# Altium footprint library AltiumLibraries.PcbLib: 247 footprints (part 9 of 16)
Each footprint in its own frame and in the unit in brackets; x right, y up, seen from the top. Pads: shape width x height; smd on the part's side, far side on the other; paste and mask are expansions set on the pad; w line width, h text height; cw(c..) or ccw(c..) is an arc to the next point about the centre after c.
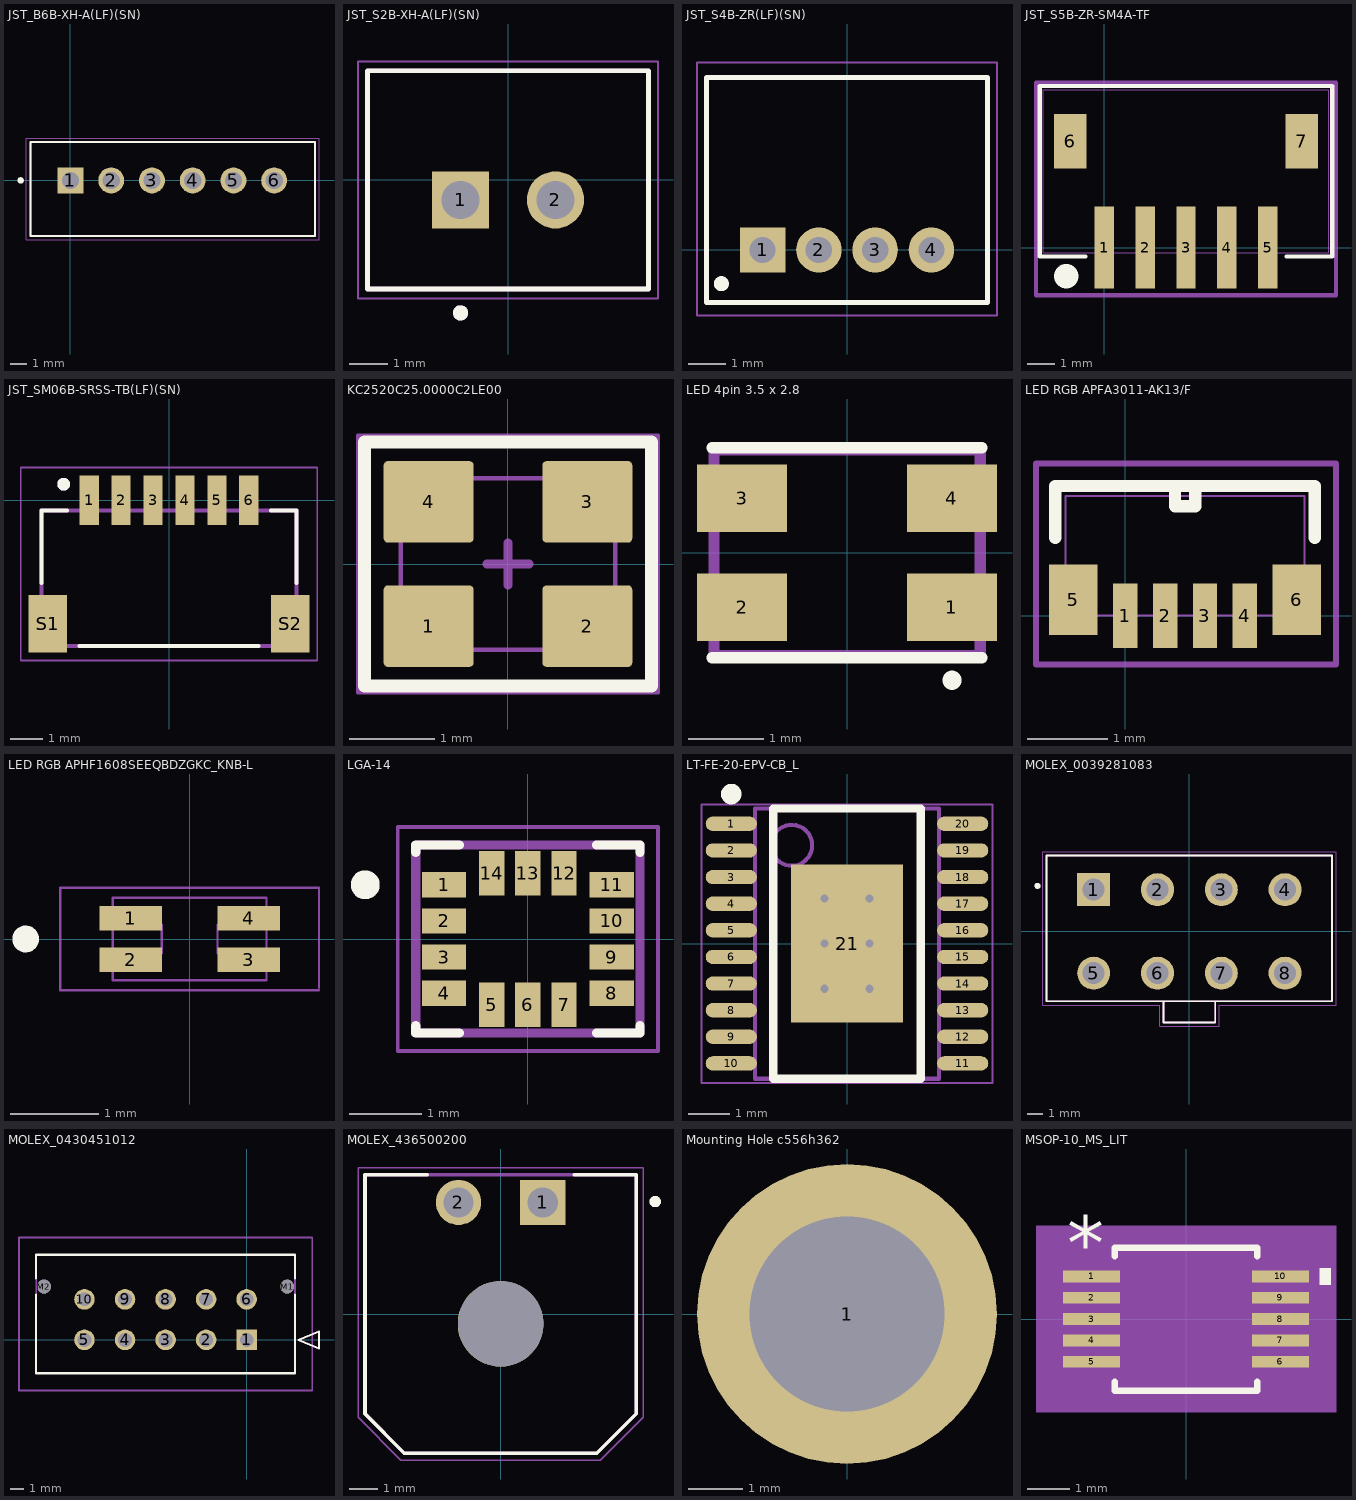
[diagram p8: the footprints below, top view; thin cyan lines are the x and y axes]

## JST_B6B-XH-A(LF)(SN) [mm]
pads (6):
  rect 1.59x1.59 hole 1.06: 1(0,0)
  round 1.59 hole 1.06: 2(2.5,0) 3(5,0) 4(7.5,0) 5(10,0) 6(12.5,0)
Top Overlay:
  circle w0.2: c-3.06,0 r0.1
  lines w0.127: -2.45,-3.4 -2.45,2.35 15,2.35 15,-3.4 -2.45,-3.4
Mechanical 13:
  lines w0.127: -2.45,-3.4 -2.45,2.35 15,2.35 15,-3.4 -2.45,-3.4
Mechanical 15:
  lines w0.05: -2.7,-3.65 -2.7,2.6 15.25,2.6 15.25,-3.65 -2.7,-3.65

## JST_S2B-XH-A(LF)(SN) [mm]
pads (2):
  rect 1.508x1.508 hole 1: 1(-1.25,-0.525)
  round 1.508 hole 1: 2(1.25,-0.525)
Top Overlay:
  circle w0.2: c-1.25,-3.5 r0.1
  lines w0.127: -3.7,-2.875 -3.7,2.875 3.7,2.875 3.7,-2.875 -3.7,-2.875
Mechanical 13:
  circle w0.2: c-1.25,-3.5 r0.1
  lines w0.127: -3.7,-2.875 -3.7,2.875 3.7,2.875 3.7,-2.875 -3.7,-2.875
Mechanical 15:
  lines w0.05: -3.95,-3.125 -3.95,3.125 3.95,3.125 3.95,-3.125 -3.95,-3.125
3D body "S2B XH-A.step": height 6.1, standoff -2, extent -3.717,-2.864 3.683,8.636

## JST_S4B-ZR(LF)(SN) [mm]
pads (4):
  rect 1.208x1.208 hole 0.7: 1(-2.25,0)
  round 1.208 hole 0.7: 2(-0.75,0) 3(0.75,0) 4(2.25,0)
Top Overlay:
  circle w0.2: c-3.35,-0.9 r0.1
  lines w0.127: -3.75,-1.4 3.75,-1.4 3.75,4.6 -3.75,4.6 -3.75,-1.4
Mechanical 16:
  lines w0.05: -4,-1.75 4,-1.75 4,5 -4,5 -4,-1.75
3D body "S4B-ZR.STEP": height 3.7, standoff -2.7, extent -3.75,-1.428 3.75,4.572

## JST_S5B-ZR-SM4A-TF [mil]
pads (7):
  rect 28x118 smd paste+0: 1(0,0) 2(59.06,0) 3(118.11,0) 4(177.17,0) 5(236.22,0)
  rect 47x79 smd: 6(-49.21,153.62) 7(285.43,153.62)
Top Overlay:
  circle w35.43: c-55.12,-41.34 r0.04
  lines w6: -27.1,-12.69 -93.39,-12.69 -93.39,233.31 329.61,233.31 329.61,-12.69 263.32,-12.69
Mechanical 13:
  lines w1: -88.39,-7.69 -88.39,228.31 324.61,228.31 324.61,-7.69 -88.39,-7.69
Mechanical 15:
  lines w6: -98.71,-69 334.93,-69 334.93,238.31 -98.71,238.31 -98.71,-69
3D body: height 10, standoff 0, extent 0,0 10,10
3D body "S5B-ZR-SM4A-TF.STEP": height 145.67, standoff 0, extent -88.39,-27.6 325,228.31

## JST_SM06B-SRSS-TB(LF)(SN) [mm]
pads (8):
  rect 0.6x1.55 smd: 1(-2.5,0) 2(-1.5,0) 3(-0.5,0) 4(0.5,0) 5(1.5,0) 6(2.5,0)
  rect 1.2x1.8 smd: S1(-3.8,-3.875) S2(3.8,-3.875)
Top Overlay:
  circle w0.2: c-3.3,0.5 r0.1
  lines w0.127: -4,-2.6 -4,-0.325 -3.2,-0.325 ; -2.8,-4.575 2.8,-4.575 ; 3.2,-0.325 4,-0.325 4,-2.6
Mechanical 13:
  circle w0.2: c-3.3,0.5 r0.1
  lines w0.127: -4,-4.575 -4,-0.325 4,-0.325 4,-4.575 -4,-4.575
Mechanical 15:
  lines w0.05: -4.65,-5.025 -4.65,1.025 4.65,1.025 4.65,-5.025 -4.65,-5.025
3D body "SM06B-SRSS-TB.STEP": height 2.91, standoff -0.05, extent -4,-4.67 4,0.28

## KC2520C25.0000C2LE00 [mm]
pads (4):
  rrect10% 1.05x0.95 smd: 1(-0.925,-0.725) 2(0.925,-0.725) 3(0.925,0.725) 4(-0.925,0.725)
Top Overlay:
  lines w0.152: -1.675,-1.425 1.675,-1.425 1.675,1.425 -1.675,1.425 -1.675,-1.425
Mechanical 13:
  lines w0.05: -1.25,-1 1.25,-1 1.25,1 -1.25,1 -1.25,-1
Mechanical 15:
  lines w0.05: -1.75,-1.5 1.75,-1.5 1.75,1.5 -1.75,1.5 -1.75,-1.5
  lines w0.1: -0.25,0 0.25,0 ; 0,-0.25 0,0.25
3D body "KC2520C25.0000C2LE00.STEP": height 0.75, standoff 0, extent -1.25,-1 1.25,1

## LED 4pin 3.5 x 2.8 [mm] "LED 3 COLOR 3.5mm x 2.8mm"
pads (4):
  rect 1.2x0.9 smd: 1(1.4,-0.725) 2(-1.4,-0.725) 3(-1.4,0.725) 4(1.4,0.725)
Top Overlay:
  circle w0.254: c1.4,-1.7 r0.001
  lines w0.152: -1.8,-1.4 1.8,-1.4 ; -1.8,1.4 1.8,1.4
Mechanical 13:
  lines w0.152: -1.774,-1.374 1.774,-1.374 1.774,1.374 -1.774,1.374 -1.774,-1.374
3D body "AAA3528.STEP": height 1.9, standoff 0, extent -1.75,-1.4 1.75,1.4

## LED RGB APFA3011-AK13/F [mil]
pads (6):
  rect 12x32 smd paste+0 mask+0: 1(0,0) 2(19.69,0) 3(39.37,0) 4(59.06,0)
  rect 24x35 smd paste+0 mask+0: 5(-25.59,7.87) 6(84.65,7.87)
Top Overlay:
  lines w6: -34.47,38.47 -34.47,64 93.53,64 93.53,38.47 ; 24.53,54 24.53,64 34.53,64 34.53,54 24.53,54
Mechanical 13:
  lines w1: -29.47,0 -29.47,59 88.53,59 88.53,0 -29.47,0
Mechanical 15:
  lines w2.95: -44,-24 104,-24 104,75 -44,75 -44,-24
3D body: height 39.37, standoff 0, extent -39,-19 99.01,69
3D body "APFA3011.step": height -1069.18, standoff -1128.33, extent -121670.11,144710.08 -121552.01,144749.46
3D body "APFA3011.step": height -1069.18, standoff -1128.33, extent -121671.11,144741.09 -121553.01,144780.46
3D body "APFA3011.step": height -1069.18, standoff -1128.33, extent -121677.11,144799.08 -121559,144838.45
3D body "APFA3011.step": height -1069.18, standoff -1128.33, extent -121699.57,144769.08 -121581.47,144808.45
3D body "APFA3011.step": height -1069.18, standoff -1128.33, extent -121639.12,144737.08 -121521.01,144776.46
3D body "APFA3011.step": height -1069.18, standoff -1128.33, extent -121639.12,144737.08 -121521.01,144776.45
3D body "APFA3011.step": height -1069.18, standoff -1128.33, extent -121639.11,144737.08 -121521,144776.46
3D body "APFA3011.step": height -1069.18, standoff -1128.33, extent -121638.11,144734.08 -121520.01,144773.46
3D body "APFA3011.step": height -1069.18, standoff -1128.33, extent -121636.11,144735.09 -121518.01,144774.46
3D body "APFA3011.step": height -1069.18, standoff -1128.33, extent -121642.1,144736.08 -121524,144775.45
3D body "APFA3011.step": height -1069.18, standoff -1128.33, extent -121642.11,144736.08 -121524.01,144775.45
3D body "APFA3011.step": height -1069.18, standoff -1128.33, extent -121687.11,144792.08 -121569,144831.46
3D body "APFA3011.step": height -1069.18, standoff -1128.33, extent -121633.11,144737.08 -121515.01,144776.46
3D body "APFA3011.step": height -1069.18, standoff -1128.33, extent -121631.11,144735.09 -121513,144774.46
3D body "APFA3011.step": height -1069.18, standoff -1128.33, extent -121653.11,144791.08 -121535.01,144830.46
3D body "APFA3011.step": height -1069.18, standoff -1128.33, extent -121634.11,144798.08 -121516.01,144837.46
3D body "APFA3011.step": height -1069.18, standoff -1128.33, extent -121648.11,144801.08 -121530,144840.46
3D body "APFA3011.sldprt": height -1069.18, standoff -1128.33, extent -121654.11,144677.08 -121536,144716.46
3D body "APFA3011.sldprt": height -1069.18, standoff -1128.33, extent -121669.11,144708.08 -121551.01,144747.46
3D body "APFA3011.sldprt": height -1069.18, standoff -1128.33, extent -121695.11,144783.08 -121577,144822.46
3D body "APFA3011.sldprt": height -1069.18, standoff -1128.33, extent -121670.11,144753.08 -121552,144792.46
3D body "APFA3011.sldprt": height -1069.18, standoff -1128.33, extent -121701.11,144816.08 -121583,144855.46
3D body "APFA3011.sldprt": height -1069.18, standoff -1128.33, extent -121694.11,144801.08 -121576,144840.45

## LED RGB APHF1608SEEQBDZGKC_KNB-L [mil]
pads (4):
  rect 28x11 smd paste+0 mask+0: 1(-26.5,9.35) 2(-26.5,-9.35) 3(26.5,-9.35) 4(26.5,9.35)
Top Overlay:
  circle w6: c-73.5,0 r3
Mechanical 13:
  circle w0: c-21.5,9.35 r3
  lines w1: -34.5,-18.5 34.5,-18.5 34.5,18.5 -34.5,18.5 -34.5,-18.5 ; -34.5,-6.5 -34.5,6.5 -12.5,6.5 -12.5,-6.5 -34.5,-6.5 ; 12.5,-6.5 12.5,6.5 34.5,6.5 34.5,-6.5 12.5,-6.5
Mechanical 15:
  lines w0.98: 58,-23 -58,-23 -58,23 58,23 58,-22
3D body "APHF1608.STEP": height 23.13, standoff 3.44, extent -31.49,-15.75 31.5,15.74
3D body: height 10, standoff 0, extent -56,-21 56,21

## LGA-14 [mm]
pads (14):
  rect 0.61x0.35 smd: 1(-1.16,0.75) 2(-1.16,0.25) 3(-1.16,-0.25) 4(-1.16,-0.75) 8(1.16,-0.75) 9(1.16,-0.25) 10(1.16,0.25) 11(1.16,0.75)
  rect 0.35x0.61 smd: 5(-0.5,-0.91) 6(0,-0.91) 7(0.5,-0.91) 12(0.5,0.91) 13(0,0.91) 14(-0.5,0.91)
Top Overlay:
  circle w0.2: c-2.25,0.75 r0.1
  lines w0.127: -1.55,-1.2 -1.55,-1.3 -0.95,-1.3 ; -1.55,1.2 -1.55,1.3 -0.95,1.3 ; 0.95,-1.3 1.55,-1.3 1.55,-1.2 ; 0.95,1.3 1.55,1.3 1.55,1.2
Mechanical 4:
  lines w0.127: -1.55,-1.3 1.55,-1.3 ; -1.55,-1.3 -1.55,1.3 ; -1.55,-1.3 1.55,-1.3 ; -1.55,-1.3 -1.55,1.3 ; -1.55,1.3 1.55,1.3 ; -1.55,1.3 1.55,1.3 ; 1.55,-1.3 1.55,1.3 ; 1.55,-1.3 1.55,1.3
Mechanical 16:
  lines w0.05: -1.8,-1.55 1.8,-1.55 1.8,1.55 -1.8,1.55 -1.8,-1.55

## LT-FE-20-EPV-CB_L [mm] "SOP, 20-Leads, Body 6.6x4.5mm, Pitch 0.65mm, Thermal Pad 3.86x2.74mm, IPC High Density"
height 1.2
pads (21):
  oval 1.25x0.35 smd: 1(-2.825,2.925) 2(-2.825,2.275) 3(-2.825,1.625) 4(-2.825,0.975) 5(-2.825,0.325) 6(-2.825,-0.325) 7(-2.825,-0.975) 8(-2.825,-1.625) 9(-2.825,-2.275) 10(-2.825,-2.925) 11(2.825,-2.925) 12(2.825,-2.275) 13(2.825,-1.625) 14(2.825,-0.975) 15(2.825,-0.325) 16(2.825,0.325) 17(2.825,0.975) 18(2.825,1.625) 19(2.825,2.275) 20(2.825,2.925)
  rect 2.74x3.86 smd: 21(0,0)
via 0.55,-1.1 diameter 0.5 hole 0.2
via -0.55,-1.1 diameter 0.5 hole 0.2
via 0.55,0 diameter 0.5 hole 0.2
via -0.55,0 diameter 0.5 hole 0.2
via 0.55,1.1 diameter 0.5 hole 0.2
via -0.55,1.1 diameter 0.5 hole 0.2
Top Overlay:
  circle w0.25: c-2.825,3.65 r0.125
  lines w0.2: -1.8,-3.3 1.8,-3.3 1.8,3.3 -1.8,3.3 -1.8,-3.3
Mechanical 13:
  circle w0.1: c-1.35,2.4 r0.5
  lines w0.1: -2.25,-3.3 2.25,-3.3 2.25,3.3 -2.25,3.3 -2.25,-3.3
Mechanical 15:
  lines w0.05: -3.55,-3.4 3.55,-3.4 3.55,3.4 -3.55,3.4 -3.55,-3.4
  lines w0.1: -0.5,0 0.5,0 ; 0,-0.5 0,0.5
3D body: height 1.2, standoff 0.05, extent -2.25,-3.3 2.25,3.3

## MOLEX_0039281083 [mm]
pads (8):
  rect 2.175x2.175 hole 1.45: 1(-6.3,2.75)
  round 2.175 hole 1.45: 2(-2.1,2.75) 3(2.1,2.75) 4(6.3,2.75) 5(-6.3,-2.75) 6(-2.1,-2.75) 7(2.1,-2.75) 8(6.3,-2.75)
Top Overlay:
  circle w0.2: c-10,3 r0.1
  lines w0.127: -1.7,-4.6 -9.4,-4.6 -9.4,5 9.4,5 9.4,-4.6 1.7,-4.6 ; -1.7,-4.6 1.7,-4.6 ; -1.7,-4.6 -1.7,-6 1.7,-6 1.7,-4.6
Mechanical 4:
  circle w0.2: c-10,3 r0.1
  circle w0.2: c-10,3 r0.1
  lines w0.127: -9.4,-4.6 -9.4,5 ; -9.4,-4.6 -1.7,-4.6 ; -9.4,-4.6 -9.4,5 ; -9.4,-4.6 -1.7,-4.6 ; -9.4,5 9.4,5 ; -9.4,5 9.4,5 ; -1.7,-6 1.7,-6 ; -1.7,-6 -1.7,-4.6 ; -1.7,-6 1.7,-6 ; -1.7,-6 -1.7,-4.6 ; -1.7,-4.6 1.7,-4.6 ; -1.7,-4.6 1.7,-4.6 ; 1.7,-6 1.7,-4.6 ; 1.7,-6 1.7,-4.6 ; 1.7,-4.6 9.4,-4.6 ; 1.7,-4.6 9.4,-4.6 ; 9.4,-4.6 9.4,5 ; 9.4,-4.6 9.4,5
Mechanical 15:
  lines w0.05: -9.65,-4.85 -1.95,-4.85 -1.95,-6.25 1.95,-6.25 1.95,-4.85 9.65,-4.85 9.65,5.25 -9.65,5.25 -9.65,-4.85

## MOLEX_0430451012 [mm]
pads (12):
  rect 1.52x1.52 hole 1.02 mask+0.076: 1(0,0)
  round 1.52 hole 1.02 mask+0.076: 2(-3,0) 3(-6,0) 4(-9,0) 5(-12,0) 6(0,3) 7(-3,3) 8(-6,3) 9(-9,3) 10(-12,3)
  round 1.02 hole 1.02 unplated mask+0.076: M1(3,3.94) M2(-15,3.94)
Top Overlay:
  lines w0.152: -15.575,3.345 -15.575,-2.47 3.575,-2.47 3.575,3.345 ; -15.575,4.535 -15.575,6.3 3.575,6.3 3.575,4.535 ; 3.829,0 5.353,-0.635 5.353,0.635 3.829,0
Mechanical 13:
  lines w0.127: -15.575,-2.47 -15.575,6.3 3.575,6.3 3.575,-2.47 -15.575,-2.47 ; 3.829,0 5.353,-0.635 5.353,0.635 3.829,0
Mechanical 15:
  lines w0.127: -16.845,-3.74 4.845,-3.74 4.845,7.57 -16.845,7.57 -16.845,-3.74
3D body: height 0.25, standoff 0, extent 0,0 0.254,0.254
3D body "430451012.stp": height 9.95, standoff -3.14, extent -15.575,-2.47 3.575,6.3

## MOLEX_436500200 [mm]
pads (3):
  rect 1.605x1.605 hole 1.07: 1(1.5,3.97)
  round 1.605 hole 1.07: 2(-1.5,3.97)
  round 3.05 hole 3.05 unplated: ""(0,-0.35)
Top Overlay:
  circle w0.2: c5.5,4 r0.1
  lines w0.127: -2.62,4.95 -4.825,4.95 -4.825,-3.55 -3.425,-4.95 3.425,-4.95 4.825,-3.55 4.825,4.95 2.62,4.95
Mechanical 13:
  circle w0.2: c5.5,4 r0.1
  lines w0.127: -4.825,-3.55 -3.425,-4.95 3.425,-4.95 4.825,-3.55 4.825,4.95 -4.825,4.95 -4.825,-3.55
Mechanical 15:
  lines w0.05: -5.075,-3.675 -3.55,-5.2 3.55,-5.2 5.075,-3.675 5.075,5.2 -5.075,5.2 -5.075,-3.675

## Mounting Hole c556h362 [mm]
pads (1):
  round 5.557 hole 3.618: 1(0,0)

## MSOP-10_MS_LIT [mil]
pads (10):
  rect 52.5x11 smd paste+0 mask+0: 1(-87.25,39.4) 2(-87.25,19.7) 3(-87.25,0) 4(-87.25,-19.7) 5(-87.25,-39.4) 6(87.25,-39.4) 7(87.25,-19.7) 8(87.25,0) 9(87.25,19.7) 10(87.25,39.4)
Top Overlay:
  region: 123.5,46.9 133.5,46.9 133.5,31.9 123.5,31.9
  lines w6: -66,-58 -66,-66 66,-66 66,-58 ; -66,58 -66,66 66,66 66,58
  text "*" at -109.75,45.4 h50
Mechanical 5:
  region: 138.5,-86 -138.5,-86 -138.5,86 138.5,86
Mechanical 13:
  lines w0: -12,61 ccw(c0,61) 12,61
  lines w1: -99.5,-44.9 -61,-44.9 -61,-33.9 -99.5,-33.9 -99.5,-44.9 ; -99.5,-25.2 -61,-25.2 -61,-14.2 -99.5,-14.2 -99.5,-25.2 ; -99.5,-5.5 -61,-5.5 -61,5.5 -99.5,5.5 -99.5,-5.5 ; -99.5,14.2 -61,14.2 -61,25.2 -99.5,25.2 -99.5,14.2 ; -99.5,33.9 -61,33.9 -61,44.9 -99.5,44.9 -99.5,33.9 ; -61,-61 -61,61 61,61 61,-61 -61,-61 ; 61,-44.9 99.5,-44.9 99.5,-33.9 61,-33.9 61,-44.9 ; 61,-25.2 99.5,-25.2 99.5,-14.2 61,-14.2 61,-25.2 ; 61,-5.5 99.5,-5.5 99.5,5.5 61,5.5 61,-5.5 ; 61,14.2 99.5,14.2 99.5,25.2 61,25.2 61,14.2 ; 61,33.9 99.5,33.9 99.5,44.9 61,44.9 61,33.9
  text "*" at -58.5,8 h50
Mechanical 15:
  region: -71,-54.9 -123.5,-54.9 -123.5,54.9 -71,54.9 -71,71 71,71 71,54.9 123.5,54.9 123.5,-54.9 71,-54.9 71,-71 -71,-71
  lines w6: -123.5,-54.9 -71,-54.9 -71,-71 71,-71 71,-54.9 123.5,-54.9 123.5,54.9 71,54.9 71,71 -71,71 -71,54.9 -123.5,54.9 -123.5,-54.9
3D body "msop-10.SLDPRT": height 39.87, standoff -5.41, extent -96.46,-59.06 96.46,59.06